# Altium footprint library Task with ESP32.PcbLib: 78 footprints (part 2 of 5)
Each footprint in its own frame and in the unit in brackets; x right, y up, seen from the top. Pads: shape width x height; smd on the part's side, far side on the other; paste and mask are expansions set on the pad; w line width, h text height; cw(c..) or ccw(c..) is an arc to the next point about the centre after c.
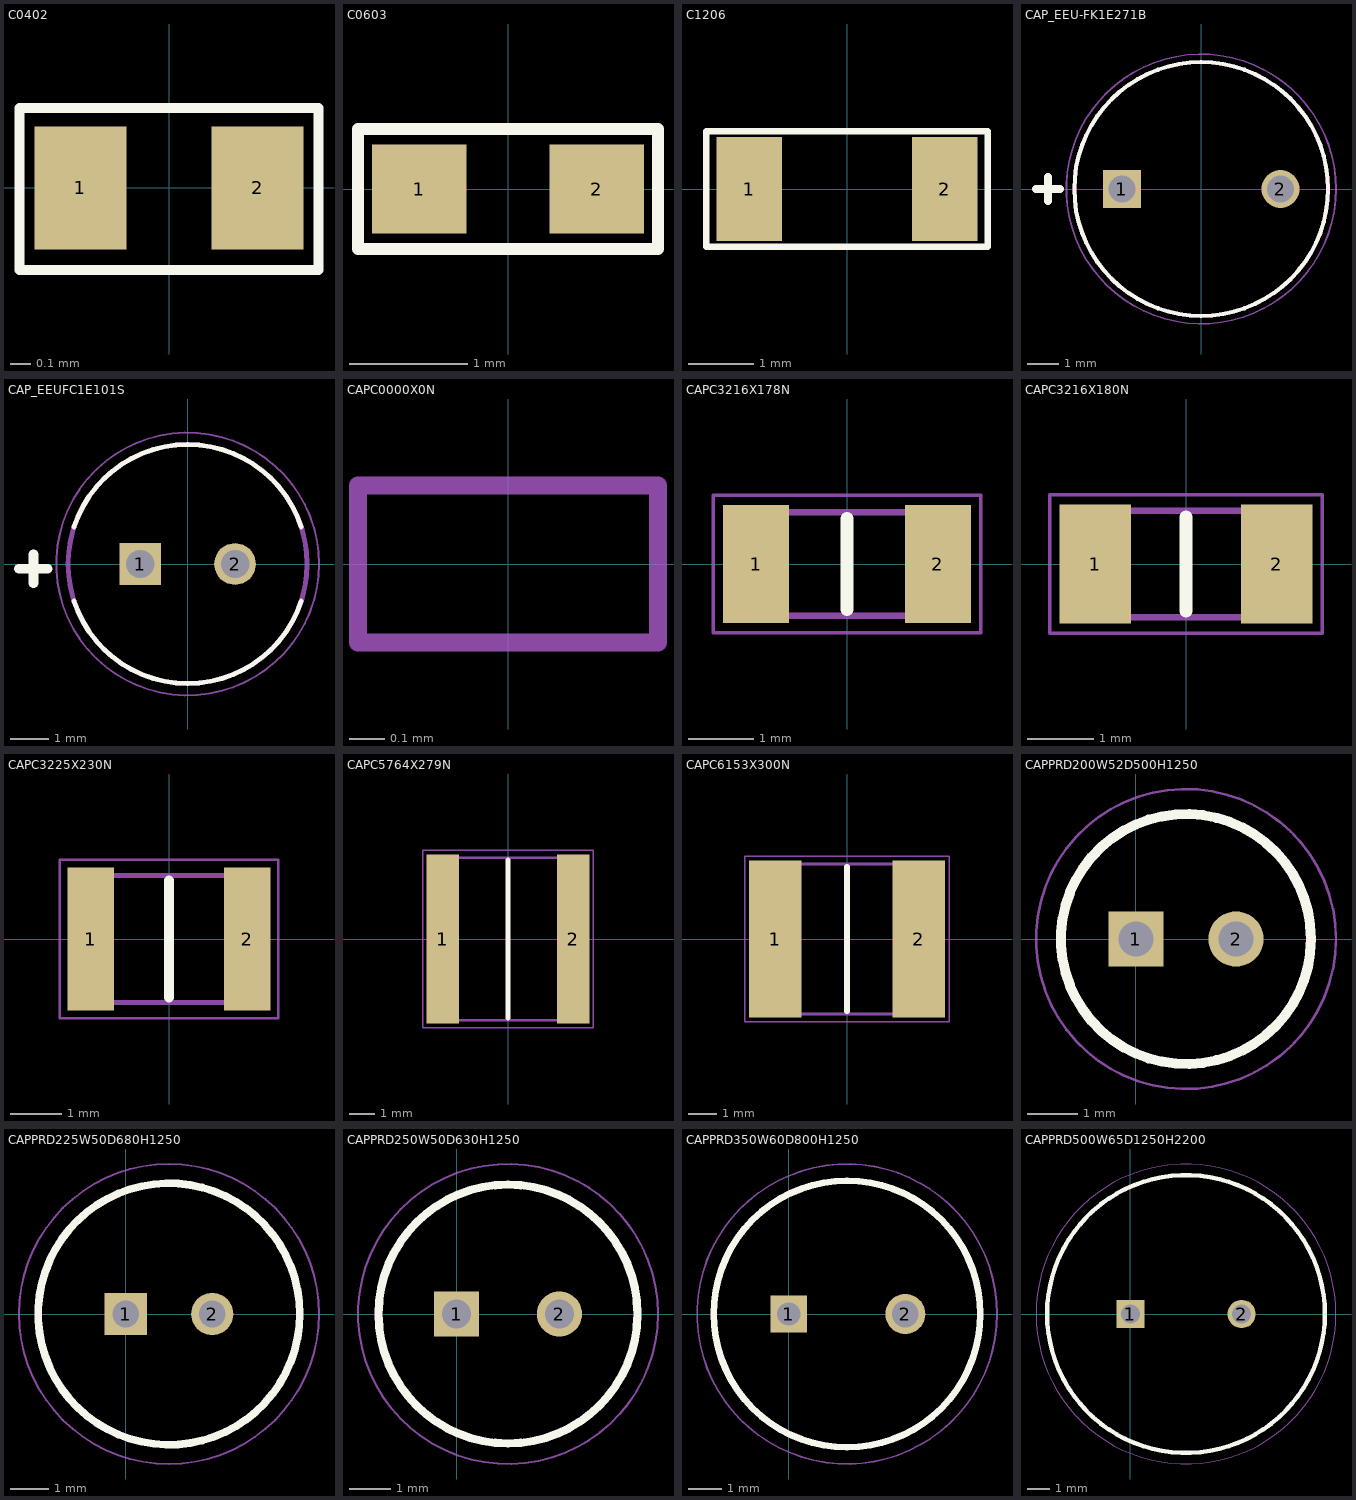
[diagram p1: the footprints below, top view; thin cyan lines are the x and y axes]

## C0402 [mm]
pads (2):
  rect 0.45x0.6 smd: 1(-0.432,0) 2(0.432,0)
Top Overlay:
  lines w0.05: -0.73,-0.4 0.73,-0.4 0.73,0.39 -0.73,0.39 -0.73,-0.4
3D body "GQM1555C2D9R5BB01J--3DModel-STEP-56544.STEP": height 0.5, standoff 0, extent -0.49,-0.27 0.51,0.28

## C0603 [mm] "CAPACITOR SMD 0603"
height 0.9
pads (2):
  rect 0.8x0.75 smd: 1(-0.75,0) 2(0.75,0)
Top Overlay:
  lines w0.1: -1.27,-0.508 -1.27,0.508 1.27,0.508 1.27,-0.508 -1.27,-0.508
3D body "User Library-0603(1608M) Cap.STEP": height 0.79, standoff 0, extent -1,-0.394 1,0.394

## C1206 [mm] "CAPACITOR SMD 1206"
height 0.94
pads (2):
  rect 1x1.6 smd: 1(-1.5,0) 2(1.5,0)
Top Overlay:
  lines w0.1: -2.159,-0.889 -2.159,0.889 2.159,0.889 2.159,-0.889 -2.159,-0.889
3D body "User Library-1206(3216M) Cap.STEP": height 1.53, standoff 0, extent -2,-0.8 2,0.8

## CAP_EEU-FK1E271B [mm]
height 13.5
pads (2):
  rect 1.2x1.2 hole 0.85: 1(-2.5,0)
  round 1.2 hole 0.85: 2(2.5,0)
Top Overlay:
  circle w0.127: c0,0 r4
  lines w0.254: -5.207,0 -4.445,0 ; -4.826,-0.381 -4.826,0.381
Mechanical 13:
  circle w0.127: c0,0 r4
Mechanical 15:
  circle w0.05: c0,0 r4.25
3D body "step_temp.STEP": height 11.5, standoff -17, extent -4,-4 4,4

## CAP_EEUFC1E101S [mm]
height 13.5
pads (2):
  rect 1.1x1.1 hole 0.75: 1(-1.25,0)
  round 1.1 hole 0.75: 2(1.25,0)
Top Overlay:
  lines w0.127: -2.996,-0.973 ccw(c0,0) 2.996,-0.973 ; -2.996,0.973 cw(c0,0) 2.996,0.973
  lines w0.254: -4.445,-0.127 -3.683,-0.127 ; -4.064,-0.508 -4.064,0.254
Mechanical 13:
  circle w0.127: c0,0 r3.15
Mechanical 15:
  circle w0.05: c0,0 r3.463
3D body "step_temp.STEP": height 11.2, standoff -17, extent -3.15,-3.149 3.15,3.149

## CAPC0000X0N [mm]
Mechanical 20:
  lines w0.05: -0.42,-0.22 0.42,-0.22 0.42,0.22 -0.42,0.22 -0.42,-0.22

## CAPC3216X178N [mm]
pads (2):
  rect 1.02x1.82 smd: 1(-1.4,0) 2(1.4,0)
Top Overlay:
  lines w0.2: 0,-0.7 0,0.7
Mechanical 15:
  lines w0.1: -1.6,-0.8 -1.6,0.8 1.6,0.8 1.6,-0.8 -1.6,-0.8
Mechanical 20:
  lines w0.05: -2.06,-1.06 -2.06,1.06 2.06,1.06 2.06,-1.06 -2.06,-1.06
3D body "12061C225MAT2A.stp": height 1.78, standoff 0, extent -1.6,-0.8 1.6,0.8

## CAPC3216X180N [mm]
pads (2):
  rect 1.07x1.78 smd: 1(-1.36,0) 2(1.36,0)
Top Overlay:
  lines w0.2: 0,-0.7 0,0.7
Mechanical 15:
  lines w0.1: -1.6,-0.8 -1.6,0.8 1.6,0.8 1.6,-0.8 -1.6,-0.8
Mechanical 20:
  lines w0.05: -2.045,-1.04 -2.045,1.04 2.045,1.04 2.045,-1.04 -2.045,-1.04
3D body "HMK316AC7225KL-TE.stp": height 1.8, standoff 0, extent -1.6,-0.8 1.6,0.8

## CAPC3225X230N [mm]
pads (2):
  rect 0.92x2.82 smd: 1(-1.54,0) 2(1.54,0)
Top Overlay:
  lines w0.2: 0,-1.15 0,1.15
Mechanical 15:
  lines w0.1: -1.6,-1.25 1.6,-1.25 1.6,1.25 -1.6,1.25 -1.6,-1.25
Mechanical 20:
  lines w0.05: -2.15,-1.56 2.15,-1.56 2.15,1.56 -2.15,1.56 -2.15,-1.56
3D body "C3225X7R2A106K250AC.stp": height 2.47, standoff -0.03, extent -1.6,-1.25 1.6,1.25

## CAPC5764X279N [mm]
pads (2):
  rect 1.28x6.62 smd: 1(-2.55,0) 2(2.55,0)
Top Overlay:
  lines w0.2: 0,-3.075 0,3.075
Mechanical 15:
  lines w0.1: -2.86,-3.175 2.86,-3.175 2.86,3.175 -2.86,3.175 -2.86,-3.175
Mechanical 20:
  lines w0.05: -3.34,-3.46 3.34,-3.46 3.34,3.46 -3.34,3.46 -3.34,-3.46
3D body "22252C225KAT2A.stp": height 2.79, standoff 0, extent -2.86,-3.175 2.86,3.175

## CAPC6153X300N [mm]
pads (2):
  rect 1.86x5.52 smd: 1(-2.53,0) 2(2.53,0)
Top Overlay:
  lines w0.2: 0,-2.55 0,2.55
Mechanical 15:
  lines w0.1: -3.05,-2.65 3.05,-2.65 3.05,2.65 -3.05,2.65 -3.05,-2.65
Mechanical 20:
  lines w0.05: -3.61,-2.91 3.61,-2.91 3.61,2.91 -3.61,2.91 -3.61,-2.91
3D body "KRM55LR72A475KH01K.stp": height 3, standoff 0, extent -3.05,-2.65 3.05,2.65

## CAPPRD200W52D500H1250 [mm]
pads (2):
  rect 1.1x1.1 hole 0.7: 1(0,0)
  round 1.1 hole 0.7: 2(2,0)
Top Overlay:
  circle w0.2: c1,0 r2.5
Mechanical 15:
  circle w0.1: c1,0 r2.5
Mechanical 20:
  circle w0.05: c1,0 r3
3D body "860040472001.stp": height 12.5, standoff -10, extent -1.75,-2.75 3.75,2.75

## CAPPRD225W50D680H1250 [mm]
pads (2):
  rect 1.1x1.1 hole 0.7: 1(0,0)
  round 1.1 hole 0.7: 2(2.25,0)
Top Overlay:
  circle w0.2: c1.125,0 r3.4
Mechanical 15:
  circle w0.1: c1.125,0 r3.4
Mechanical 20:
  circle w0.05: c1.125,0 r3.9
3D body "RGA101M1EBK-0611G.stp": height 12.5, standoff -10, extent -2.275,-3.4 4.525,3.4

## CAPPRD250W50D630H1250 [mm]
pads (2):
  rect 1.1x1.1 hole 0.7: 1(0,0)
  round 1.1 hole 0.7: 2(2.5,0)
Top Overlay:
  circle w0.2: c1.25,0 r3.15
Mechanical 15:
  circle w0.1: c1.25,0 r3.15
Mechanical 20:
  circle w0.05: c1.25,0 r3.65
3D body "UPW1E101MED1TD.STEP": height 12.5, standoff -19, extent -1.88,-3.147 4.42,3.147

## CAPPRD350W60D800H1250 [mm]
pads (2):
  rect 1.1x1.1 hole 0.7: 1(0,0)
  round 1.2 hole 0.8: 2(3.5,0)
Top Overlay:
  circle w0.2: c1.75,0 r4
Mechanical 15:
  circle w0.1: c1.75,0 r4
Mechanical 20:
  circle w0.05: c1.75,0 r4.5
3D body "ESH107M050AG3AA.stp": height 12.7, standoff -19.8, extent -2.472,-4.25 6.028,4.25

## CAPPRD500W65D1250H2200 [mm]
pads (2):
  rect 1.275x1.275 hole 0.85: 1(0,0)
  round 1.275 hole 0.85: 2(5,0)
Top Overlay:
  circle w0.2: c2.5,0 r6.25
Mechanical 15:
  circle w0.1: c2.5,0 r6.25
Mechanical 20:
  circle w0.05: c2.5,0 r6.75
3D body "ECA-2AM221B.STEP": height 20, standoff -17, extent -3.71,-6.249 8.79,6.249